# Altium footprint library my Library.PcbLib: 1247 footprints (part 77 of 78)
Each footprint in its own frame and in the unit in brackets; x right, y up, seen from the top. Pads: shape width x height; smd on the part's side, far side on the other; paste and mask are expansions set on the pad; w line width, h text height; cw(c..) or ccw(c..) is an arc to the next point about the centre after c.
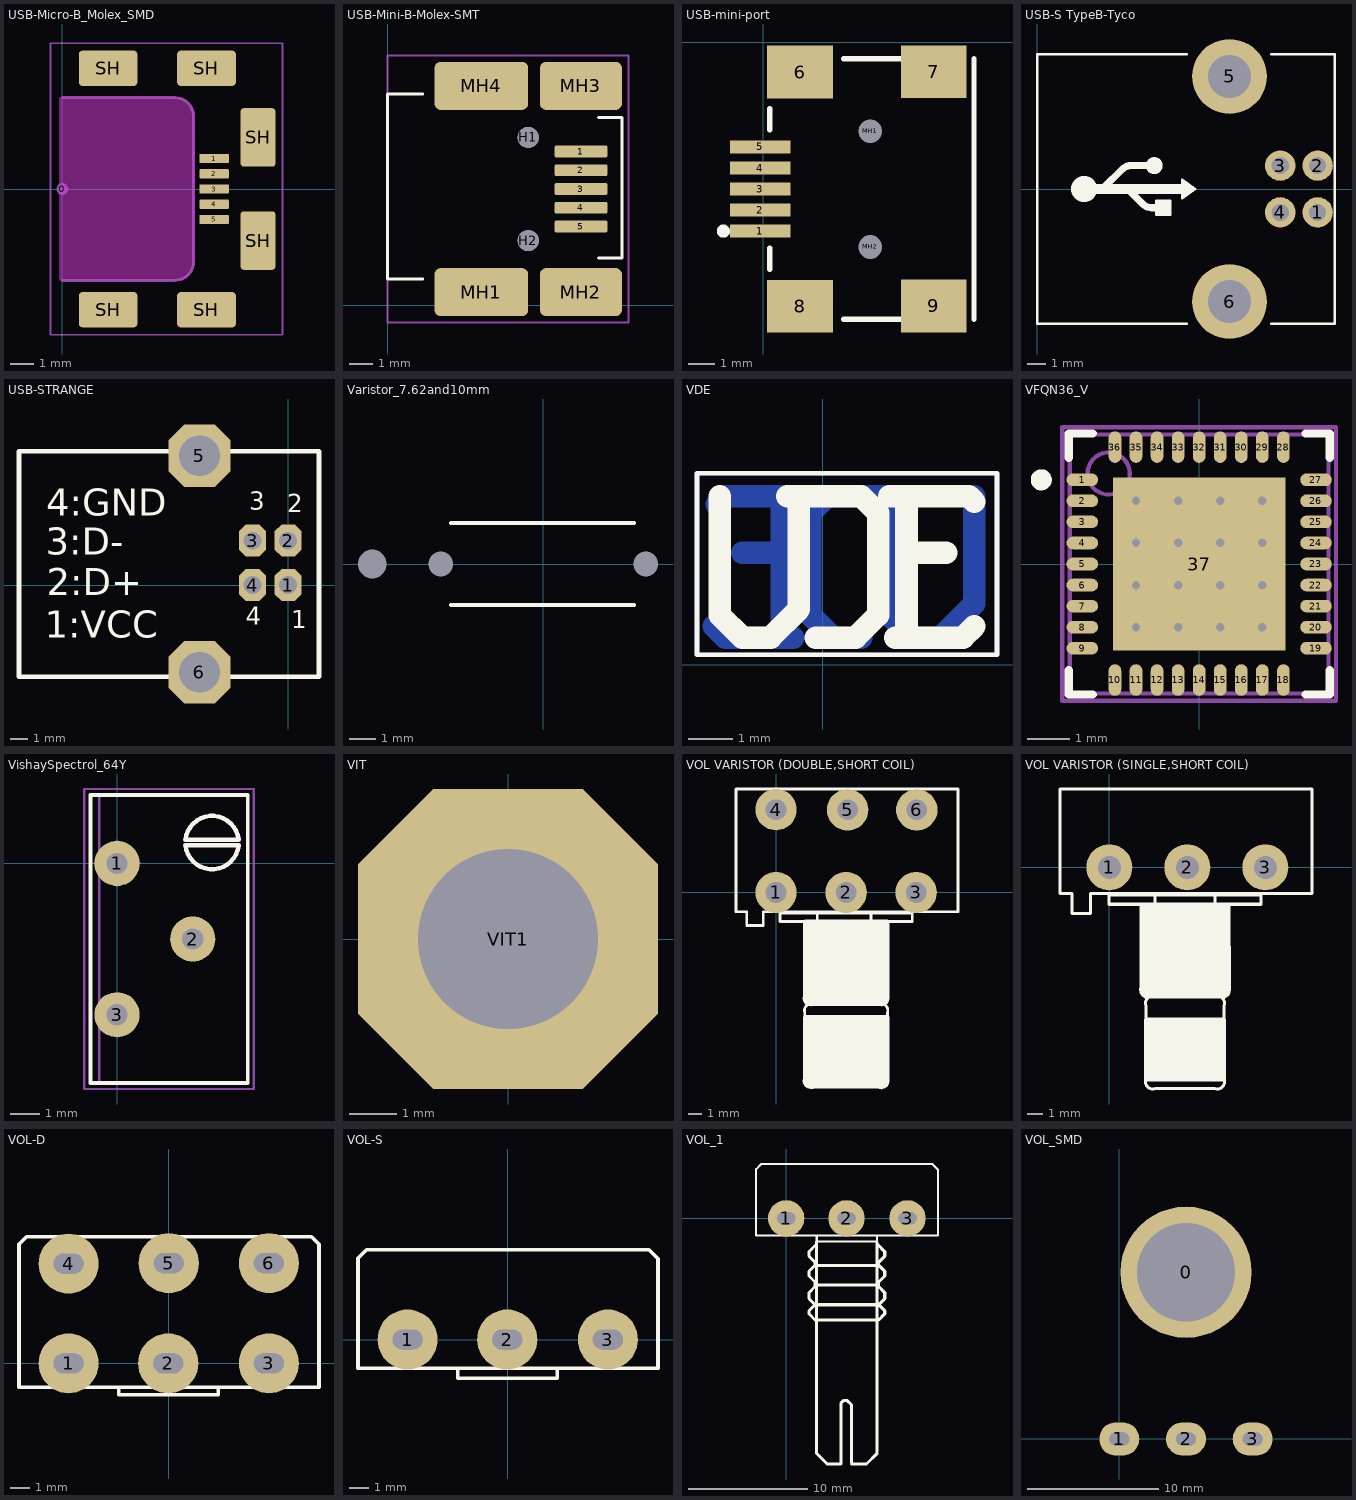
[diagram p76: the footprints below, top view; thin cyan lines are the x and y axes]

## USB-Micro-B_Molex_SMD [mm]
height 1.2
pads (12):
  round 0.508 on Mech15: 0(0,0)
  rrect20% 1.25x0.4 smd: 1(6.475,1.3) 2(6.475,0.65) 3(6.475,0) 4(6.475,-0.65) 5(6.475,-1.3)
  rrect20% 2.5x1.5 smd: SH(1.95,-5.15) SH(1.95,5.15) SH(6.15,-5.15) SH(6.15,5.15)
  rrect20% 1.5x2.5 smd: SH(8.35,-2.2) SH(8.35,2.2)
Top Solder:
  rectangle: 5.842,-1.27 7.112,1.27
Keep-Out Layer:
  board cut-out: -0.127,3.9 4.8,3.9 4.879,3.9 5.033,3.869 5.179,3.809 5.31,3.721 5.421,3.61 5.509,3.479 5.569,3.333 5.6,3.179 5.6,3.1 5.6,-3.1 5.6,-3.179 5.569,-3.333 5.509,-3.479 5.421,-3.61 5.31,-3.721 5.179,-3.809 5.033,-3.869 4.879,-3.9 4.8,-3.9 -0.127,-3.9
Mechanical 13:
  lines w0.127: 0,-3.9 4.8,-3.9 ccw(c4.8,-3.1) 5.6,-3.1 5.6,3.1 ccw(c4.8,3.1) 4.8,3.9 0,3.9
Mechanical 15:
  lines w0.076: -0.5,-6.223 9.398,-6.223 9.398,6.223 -0.5,6.223 -0.5,-6.223
3D body "Micro USB B Receptacle Middle Mount.STEP": height 1.43, standoff -1.52, extent -0.43,-5.5 8.7,5.5

## USB-Mini-B-Molex-SMT [mm]
height 3.95
pads (11):
  rrect25% 2.25x0.5 smd: 1(8.25,6.55) 2(8.25,5.75) 3(8.25,4.95) 4(8.25,4.15) 5(8.25,3.35)
  round 0.9 hole 0.9 unplated: H1(6,7.15) H2(6,2.75)
  rrect25% 4x2.05 smd: MH1(4,0.55) MH4(4,9.35)
  rrect25% 3.5x2.05 smd: MH2(8.25,0.55) MH3(8.25,9.35)
Top Overlay:
  lines w0.127: 1.5,1.1 0,1.1 0,9 1.5,9 ; 9,2 10,2 10,8 9,8
Mechanical 15:
  lines w0.076: 0,-0.75 0,10.65 10.275,10.65 10.275,-0.75 0,-0.75
3D body: height 3.95, standoff 0, extent 0,1.1 9,9

## USB-mini-port [mm]
height 7.62
pads (11):
  rect 2.3x0.5 smd: 1(-0.127,-7.188) 2(-0.127,-6.388) 3(-0.127,-5.588) 4(-0.127,-4.788) 5(-0.127,-3.988)
  rect 2.5x2 smd: 6(1.394,-1.138) 7(6.477,-1.133) 8(1.394,-10.038) 9(6.477,-10.033)
  round 0.6 hole 0.9 unplated: MH1(4.064,-3.388) MH2(4.064,-7.788)
Top Overlay:
  circle w0.25: c-1.524,-7.188 r0.125
  lines w0.2: 0.244,-8.638 0.244,-7.838 ; 0.244,-3.338 0.244,-2.538 ; 3.044,-10.538 5.244,-10.538 ; 3.044,-0.638 5.244,-0.638 ; 8.001,-10.538 8.001,-0.638
Mechanical 1:
  text "PCB Edge" at 9.576,-9.624 h0.25
3D body "User Library-UX60SA-MB-5ST HIrose Mini USB.STEP": height 4.41, standoff -0.48, extent 0,-10.538 7.143,-0.638

## USB-S TypeB-Tyco [mm]
height 11.1
pads (6):
  round 1.626 hole 0.914: 1(14.99,-1.25) 2(14.99,1.25) 3(12.99,1.25) 4(12.99,-1.25)
  round 4 hole 2.3: 5(10.28,6.02) 6(10.28,-6.02)
Top Overlay:
  circle w0.508: c6.25,1.25 r0.2
  circle w0.889: c2.5,0 r0.254
  region: 7.1,-1.375 6.35,-1.375 6.35,-0.625 7.1,-0.625
  region: 8.45,0 7.75,-0.5 7.75,0.5
  lines w0.127: 8,-7.2 0,-7.2 0,7.2 8,7.2 ; 12.5,-7.2 15.9,-7.2 15.9,7.2 12.5,7.2 ; 6.35,-1.375 7.1,-1.375 7.1,-0.625 6.35,-0.625 6.35,-1.375 ; 7.75,-0.5 7.75,0.5 8.45,0 7.75,-0.5
  lines w0.381: 3.547,0.062 4.547,1.062 cw(c5,0.61) 5,1.25 6.25,1.25 ; 4.897,-0.062 5.647,-0.812 ccw(c6.1,-0.36) 6.1,-1 6.35,-1
  lines w0.508: 3,0 7.75,0
3D body "c-0292304-01-b-3d.stp": height 11.5, standoff -3.93, extent 0,-7.194 15.7,7.194

## USB-STRANGE [mm] "USB Type B - STRANGE - Slave Device"
pads (6):
  oct 1.5x1.8 hole 1: 1(0,0) 2(0,2.5) 3(-2,2.5) 4(-2,0)
  oct 3.5x3.5 hole 2.3: 5(-4.988,7.283) 6(-4.988,-4.909)
Top Overlay:
  lines w0.254: -15.148,-5.163 1.743,-5.163 1.743,7.537 -15.148,7.537 -15.148,-5.163
  text "4" at -2.372,-2.242 h1
  text "2" at -0.035,4.108 h1
  text "3" at -2.194,4.235 h1
  text "1" at 0.193,-2.42 h1
  text "4:GND" at -13.624,3.905 h1.52
  text "3:D-" at -13.65,1.695 h1.52
  text "2:D+" at -13.574,-0.565 h1.52
  text "1:VCC" at -13.701,-2.978 h1.52
3D body "Samtec-USB-B-S-F-B-TH-Strange.step": height 10.98, standoff -3.24, extent -15.45,-6.179 0.85,8.68

## Varistor_7.62and10mm [mil] "Capacitor, Ceramic, Thru-Hole, Dipped Radial; Body 6.8 x 3 mm (WxT) Pin Spacing 7.62 mm (typ)"
height 236.22
pads (3):
  round 0 / inner round 0 / far side round 100 hole 42 unplated: 1(-250,0)
  round 0 / inner round 0 / far side oval 100x85 hole 36 unplated: 1(-150,0) 2(150,0)
Top Overlay:
  lines w6: -135,-60 132.72,-60 ; -135,60 132.72,60
3D body "MOV-10N331k_V.STEP": height 472.44, standoff -98.43, extent -216.47,-69.98 216.44,68.36

## VDE [mm] "VDE - SM"
Bottom Layer:
  lines w0.102: -2.819,0.229 -2.819,4.293 3.912,4.293 3.912,0.229 -2.819,0.229
  lines w0.508: -2.438,0.864 -2.184,0.61 -1.803,0.61 -0.914,0.61 -0.914,3.785 -2.184,3.785 -2.375,3.594 ; -1.803,2.515 -0.914,2.515 ; -1.549,3.785 -0.533,3.785 ; -1.295,0.61 -0.66,0.61 ; 0.864,0.61 0.229,0.61 -0.279,1.118 -0.279,3.404 0.102,3.785 1.753,3.785 ; 1.372,3.785 1.372,1.245 2.007,0.61 2.642,0.61 3.404,1.372 3.404,3.785
Top Overlay:
  lines w0.102: -2.819,0.229 3.912,0.229 3.912,4.293 -2.819,4.293 -2.819,0.229
  lines w0.508: -2.311,3.785 -2.311,1.118 -1.803,0.61 -1.549,0.61 -1.422,0.61 -1.168,0.61 -0.533,1.245 -0.533,3.785 0.864,3.785 1.245,3.404 1.245,1.118 0.737,0.61 -0.152,0.61 ; -0.787,3.785 0.229,3.785 ; 1.499,3.785 2.261,3.785 ; 1.626,0.61 3.15,0.61 3.404,0.864 ; 1.88,0.864 1.88,3.785 3.277,3.785 3.404,3.658 ; 1.88,2.515 2.769,2.515

## VFQN36_V [mm] "QFN, 36-Leads, Body 6x6mm, Pitch 0.5mm, ST Recommended"
height 1
pads (37):
  oval 0.75x0.3 smd: 1(-2.775,2) 2(-2.775,1.5) 3(-2.775,1) 4(-2.775,0.5) 5(-2.775,0) 6(-2.775,-0.5) 7(-2.775,-1) 8(-2.775,-1.5) 9(-2.775,-2) 19(2.775,-2) 20(2.775,-1.5) 21(2.775,-1) 22(2.775,-0.5) 23(2.775,0) 24(2.775,0.5) 25(2.775,1) 26(2.775,1.5) 27(2.775,2)
  oval 0.3x0.75 smd: 10(-2,-2.755) 11(-1.5,-2.755) 12(-1,-2.755) 13(-0.5,-2.755) 14(0,-2.755) 15(0.5,-2.755) 16(1,-2.755) 17(1.5,-2.755) 18(2,-2.755) 28(2,2.775) 29(1.5,2.775) 30(1,2.775) 31(0.5,2.775) 32(0,2.775) 33(-0.5,2.775) 34(-1,2.775) 35(-1.5,2.775) 36(-2,2.775)
  rect 4.1x4.1 smd: 37(0,0)
via 1.5,-1.5 diameter 0.4 hole 0.2
via 0.5,-1.5 diameter 0.4 hole 0.2
via -0.5,-1.5 diameter 0.4 hole 0.2
via -1.5,-1.5 diameter 0.4 hole 0.2
via 1.5,-0.5 diameter 0.4 hole 0.2
via 0.5,-0.5 diameter 0.4 hole 0.2
via -0.5,-0.5 diameter 0.4 hole 0.2
via -1.5,-0.5 diameter 0.4 hole 0.2
via 1.5,0.5 diameter 0.4 hole 0.2
via 0.5,0.5 diameter 0.4 hole 0.2
via -0.5,0.5 diameter 0.4 hole 0.2
via -1.5,0.5 diameter 0.4 hole 0.2
via 1.5,1.5 diameter 0.4 hole 0.2
via 0.5,1.5 diameter 0.4 hole 0.2
via -0.5,1.5 diameter 0.4 hole 0.2
via -1.5,1.5 diameter 0.4 hole 0.2
Top Overlay:
  circle w0.25: c-3.75,2 r0.125
  lines w0.2: -3.1,-2.525 -3.1,-3.1 -2.525,-3.1 ; -3.1,2.525 -3.1,3.1 -2.525,3.1 ; 2.525,-3.1 3.1,-3.1 3.1,-2.525 ; 2.525,3.1 3.1,3.1 3.1,2.525
Mechanical 13:
  circle w0.1: c-2.15,2.15 r0.5
  lines w0.1: -3.075,3.05 -3.075,-3.075 3.075,-3.075 3.075,3.075 -3.075,3.075
Mechanical 15:
  lines w0.1: -0.5,0 0.5,0 ; 0,-0.5 0,0.5 ; -3.25,-3.25 3.25,-3.25 3.25,3.25 -3.25,3.25 -3.25,-3.25
3D body: height 1, standoff 0, extent -3.05,-3.05 3.05,3.05

## VishaySpectrol_64Y [mil] "VISHAY SPECTROL - 64Y - TRIMMER"
height 437.01
pads (3):
  round 60 hole 28: 1(0,0) 2(100.39,-100.39) 3(0,-200.79)
Top Overlay:
  lines w5: -35.43,-291.34 173.23,-291.34 173.23,90.55 -35.43,90.55 -35.43,-291.34
  lines w6: 90.69,23.81 161.27,23.81 ; 90.68,31.31 161.28,31.31 ; 90.75,23.82 ccw(c125.98,27.55) 161.21,23.82 ; 90.74,31.3 cw(c125.98,27.55) 161.22,31.3
Mechanical 13:
  lines w3: -23.62,-291.34 173.23,-291.34 173.23,90.55 -23.62,90.55 -23.62,-291.34
Mechanical 15:
  lines w3: -30,0 30,0 ; 0,-30 0,30 ; -43.62,-299.34 -43.62,98.66 181.38,98.66 181.38,-299.34 -43.62,-299.34
3D body: height 437.01, standoff 385.83, extent 82.68,-15.75 168.95,70.7
3D body: height 385.83, standoff 0, extent -23.62,-291.34 173.23,90.55

## VIT [mm] "VIT"
height 0.005
pads (1):
  oct 6.35x6.35 hole 3.81: VIT1(0,0)

## VOL VARISTOR (DOUBLE,SHORT COIL) [mm]
pads (6):
  round 3 hole 1.5: 1(0,0) 2(5.08,0) 3(10.16,0) 4(0,6.003) 5(5.19,5.991) 6(10.201,5.991)
Top Overlay:
  region: 8.119,-2.009 8.158,-2.024 8.158,-2.025 8.174,-2.063 8.19,-2.101 8.193,-7.492 8.221,-7.632 8.217,-7.653 8.221,-7.675 8.184,-7.86 8.172,-7.878 8.168,-7.899 8.063,-8.056 8.045,-8.068 8.033,-8.086 7.876,-8.191 7.855,-8.195 7.837,-8.207 7.652,-8.244 7.631,-8.239 7.61,-8.244 7.459,-8.213 7.457,-8.212 2.691,-8.216 2.55,-8.244 2.529,-8.239 2.507,-8.244 2.322,-8.207 2.304,-8.195 2.283,-8.191 2.126,-8.086 2.114,-8.068 2.096,-8.056 1.991,-7.899 1.987,-7.878 1.975,-7.86 1.938,-7.675 1.943,-7.653 1.938,-7.632 1.968,-7.481 1.97,-7.478 1.97,-2.101 2.002,-2.025 2.079,-1.993 8.081,-1.993
  region: 8.158,-8.928 8.19,-9.004 8.19,-13.482 8.191,-13.484 8.221,-13.635 8.217,-13.656 8.221,-13.677 8.184,-13.863 8.172,-13.881 8.168,-13.902 8.063,-14.059 8.045,-14.071 8.033,-14.088 7.876,-14.193 7.855,-14.198 7.837,-14.21 7.652,-14.246 7.631,-14.242 7.61,-14.246 7.469,-14.218 2.703,-14.214 2.701,-14.216 2.55,-14.246 2.529,-14.242 2.507,-14.246 2.322,-14.209 2.305,-14.197 2.283,-14.193 2.127,-14.088 2.115,-14.07 2.097,-14.058 1.992,-13.901 1.988,-13.88 1.976,-13.862 1.939,-13.677 1.943,-13.656 1.939,-13.635 1.969,-13.484 1.97,-13.482 1.97,-9.004 2.002,-8.928 2.079,-8.896 8.081,-8.896
  lines w0.2: 2.679,-14.107 7.481,-14.107 ccw(c7.631,-13.656) 8.081,-13.506 8.081,-8.704 ccw(c7.631,-8.554) 7.481,-8.103 ; 2.679,-14.106 cw(c2.529,-13.656) 2.079,-13.506 2.079,-8.704 cw(c2.529,-8.554) 2.679,-8.104 ; 2.679,-8.103 cw(c2.529,-7.653) 2.079,-7.504 2.079,-2.101 8.081,-2.101 8.081,-7.504 cw(c7.631,-7.653) 7.481,-8.104 ; 2.679,-8.104 7.481,-8.104 ; 2.679,-8.104 7.481,-8.104 ; -2.897,-1.4 -2.123,-1.4 -2.123,-2.399 -0.923,-2.399 -0.923,-1.4 13.184,-1.4 13.184,7.504 -2.897,7.504 -2.897,-1.4 ; 0.278,-2.101 9.882,-2.101 9.882,-1.501 0.278,-1.501 0.278,-2.101 ; 2.979,-2.101 2.979,-1.501 6.881,-1.501 6.881,-2.101 2.979,-2.101

## VOL VARISTOR (SINGLE,SHORT COIL) [mm]
pads (3):
  round 3 hole 1.5: 1(0,0) 2(5.08,0) 3(10.16,0)
Top Overlay:
  region: 7.819,-2.309 7.858,-2.325 7.874,-2.363 7.889,-2.401 7.893,-7.792 7.921,-7.932 7.917,-7.954 7.921,-7.975 7.884,-8.16 7.872,-8.178 7.868,-8.199 7.763,-8.356 7.745,-8.368 7.733,-8.386 7.576,-8.491 7.555,-8.495 7.537,-8.507 7.352,-8.544 7.331,-8.539 7.31,-8.544 7.159,-8.514 7.157,-8.512 2.691,-8.516 2.55,-8.544 2.529,-8.54 2.507,-8.544 2.322,-8.507 2.304,-8.495 2.283,-8.491 2.126,-8.386 2.114,-8.368 2.096,-8.356 1.991,-8.199 1.987,-8.178 1.975,-8.16 1.938,-7.975 1.943,-7.954 1.938,-7.932 1.968,-7.781 1.97,-7.778 1.97,-2.401 2.002,-2.325 2.079,-2.293 7.781,-2.293
  region: 7.558,-9.828 7.589,-9.905 7.589,-13.807 7.558,-13.883 7.481,-13.915 2.379,-13.915 2.302,-13.883 2.271,-13.807 2.271,-9.905 2.302,-9.828 2.379,-9.797 7.481,-9.797
  lines w0.2: 2.078,-7.804 ccw(c2.529,-7.954) 2.679,-8.404 7.181,-8.404 ccw(c7.331,-7.954) 7.781,-7.804 7.781,-2.401 2.079,-2.401 2.079,-7.804 ; -3.197,-1.7 -3.197,5.102 13.184,5.102 13.184,-1.7 -1.223,-1.7 -1.223,-3.001 -2.424,-3.001 -2.424,-1.7 -3.197,-1.7 ; -0.022,-2.401 9.882,-2.401 9.882,-1.801 -0.022,-1.801 -0.022,-2.401 ; 2.379,-13.807 ccw(c2.829,-13.956) 2.979,-14.406 6.881,-14.407 ccw(c7.031,-13.956) 7.481,-13.807 7.481,-9.004 ccw(c7.031,-8.854) 6.881,-8.404 2.979,-8.404 ccw(c2.829,-8.854) 2.379,-9.004 2.379,-13.807 ; 2.979,-2.401 2.979,-1.801 6.881,-1.801 6.881,-2.401 2.979,-2.401

## VOL-D [mil] "Volume control Dual"
height 400
pads (6):
  round 120 hole 40 slot 60 at 0 deg: 1(-200,0) 2(-1,0) 3(200,0) 4(-200,199) 5(0,200) 6(200,200)
Top Overlay:
  lines w7: -100,-48 -100,-63 99,-63 99,-48 ; -299,-48 300,-48 300,238 285,253 -284,253 -299,238 -299,-48
3D body "SW3dPS-ALPHA-potentiometer stereo PCB mount.STEP": height 834.65, standoff -129.92, extent -338.65,-1309.27 330.65,299

## VOL-S [mil] "Volume control single"
height 400
pads (3):
  round 120 hole 40 slot 60 at 0 deg: 1(-200,0) 2(-1,0) 3(200,0)
Top Overlay:
  lines w7: -100,-57 -100,-77 99,-77 99,-57 ; -299,-57 300,-57 300,161 282,179 -282,179 -299,162 -299,-57

## VOL_1 [mil] "Resistorvar Volume"
pads (3):
  round 120 hole 40 slot 60 at 0 deg: 1(0,0) 2(199,0) 3(400,0)
Top Overlay:
  lines w7: 100,-57 100,-77 299,-77 299,-57 ; 101,-77 101,-57 ; -99,-57 -99,162 -82,179 482,179 500,161 500,-57 -99,-57
  lines w10: 95,-335 75,-315 75,-305 95,-285 75,-265 75,-245 95,-225 95,-210 75,-190 75,-175 95,-155 95,-145 75,-125 75,-110 100,-85 ; 95,-220 300,-220 ; 100,-770 100,-77 ; 100,-760 100,-775 135,-810 180,-810 180,-610 190,-600 200,-600 215,-615 215,-805 ; 100,-335 305,-335 325,-315 325,-305 305,-285 ; 100,-285 305,-285 ; 105,-155 300,-155 ; 215,-810 265,-810 300,-775 ; 300,-770 300,-80 ; 300,-85 325,-110 325,-125 305,-145 305,-155 325,-175 325,-190 305,-210 305,-225 325,-245 325,-265 305,-285
3D body "SW3dPS-Pot.STEP": height 839.35, standoff -130, extent -110,-818.11 510,188.11

## VOL_SMD [mil] "Resistorvar Volume"
pads (4):
  round 393.7 hole 295.28: 0(200,500)
  oval 120x100 hole 40 slot 60 at 0 deg: 1(0,0) 2(200,0) 3(400,0)
Bottom Overlay:
  circle w12: c400,150 r50
  circle w12: c200,150 r50
  circle w12: c0,150 r50
  circle w12: c200,500 r215.01
  lines w12: -57.25,301.71 cw(c200,500) 455.57,299.55 ; -55,299 127,299 ; -49,700 119,700 ; 281,298 455,298 ; 286,698 454,698 ; 455,295 500,250 500,-75 -100,-75 -100,255 ; -100,255 -55,300 -100,255
3D body "SW3dPS-omeg pot.STEP": height 866.14, standoff -407.48, extent -203.15,-247.08 600,947.08